# Altium footprint library Power_Lib_Altium.PcbLib: 383 footprints (part 9 of 24)
Each footprint in its own frame and in the unit in brackets; x right, y up, seen from the top. Pads: shape width x height; smd on the part's side, far side on the other; paste and mask are expansions set on the pad; w line width, h text height; cw(c..) or ccw(c..) is an arc to the next point about the centre after c.
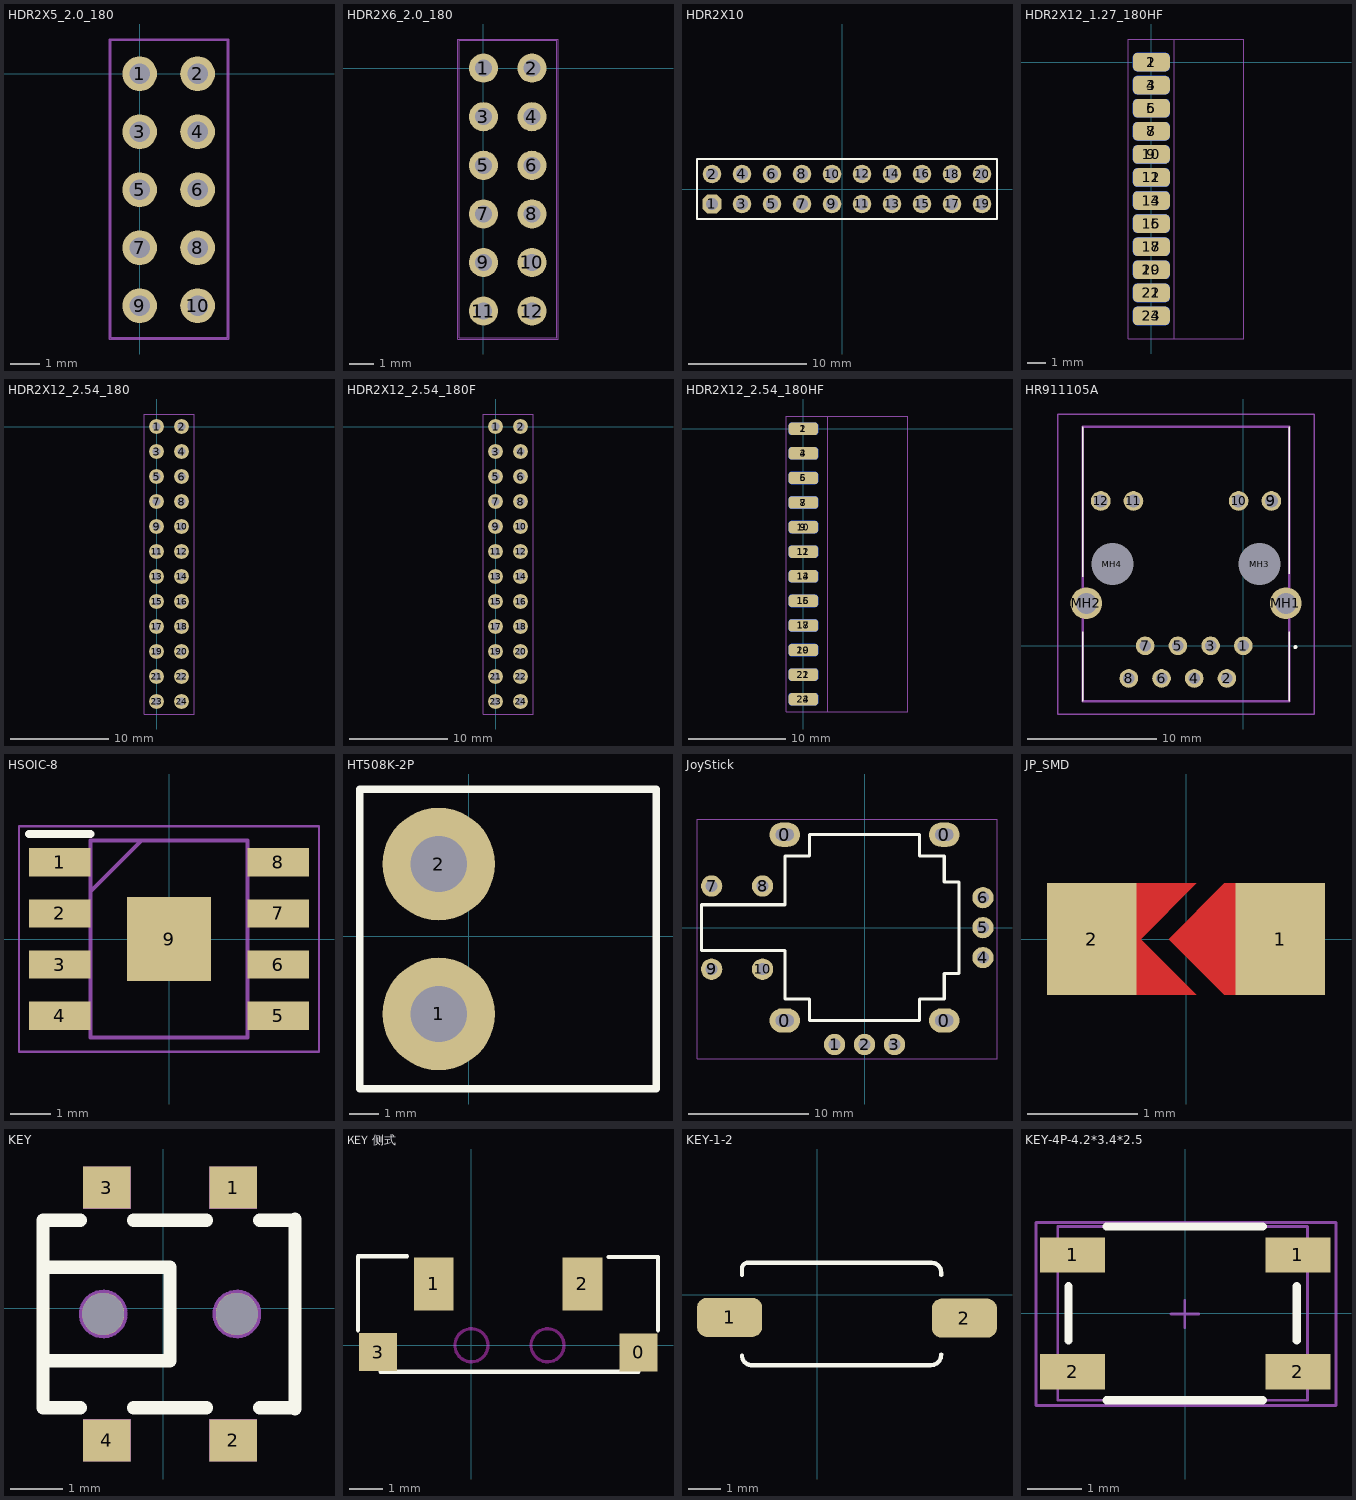
[diagram p8: the footprints below, top view; thin cyan lines are the x and y axes]

## HDR2X5_2.0_180 [mm]
height 4.3
pads (10):
  round 1.2 hole 0.7: 1(0,0) 2(2,0) 3(0,-2) 4(2,-2) 5(0,-4) 6(2,-4) 7(0,-6) 8(2,-6) 9(0,-8) 10(2,-8)
Mechanical 13:
  lines w0.051: -1,-9.1 -1,1.15 3.025,1.15 3.025,-9.1 -1,-9.1
Mechanical 14:
  lines w0.051: -1.05,-9.15 -1.05,1.2 3.075,1.2 3.075,-9.15 -1.05,-9.15

## HDR2X6_2.0_180 [mm]
height 4.3
pads (12):
  round 1.2 hole 0.7: 1(0,0) 2(2,0) 3(0,-2) 4(2,-2) 5(0,-4) 6(2,-4) 7(0,-6) 8(2,-6) 9(0,-8) 10(2,-8) 11(0,-10) 12(2,-10)
Mechanical 13:
  lines w0.051: -1,-11.1 3.025,-11.1 3.025,1.15 -1,1.15 -1,-11.1
Mechanical 14:
  lines w0.051: -1.05,-11.15 3.075,-11.15 3.075,1.2 -1.05,1.2 -1.05,-11.15

## HDR2X10 [mil]
pads (20):
  oct 62x62 hole 40: 1(-435,-50)
  round 62 hole 40: 2(-435,50) 3(-335,-50) 4(-335,50) 5(-235,-50) 6(-235,50) 7(-135,-50) 8(-135,50) 9(-35,-50) 10(-35,50) 11(65,-50) 12(65,50) 13(165,-50) 14(165,50) 15(265,-50) 16(265,50) 17(365,-50) 18(365,50) 19(465,-50) 20(465,50)
Top Overlay:
  lines w8: -485,-100 -485,100 -410,100 515,100 515,-100 -410,-100 -485,-100
3D body "User Library-1x2 TH Pitch 2_54mm.SLDPRT": height 373.85, standoff -125.98, extent 416,-99 516,101
3D body "User Library-1x2 TH Pitch 2_54mm.SLDPRT": height 373.85, standoff -125.98, extent 316,-99 416,101
3D body "User Library-1x2 TH Pitch 2_54mm.SLDPRT": height 373.85, standoff -125.98, extent 216,-99 316,101
3D body "User Library-1x2 TH Pitch 2_54mm.SLDPRT": height 373.85, standoff -125.98, extent 116,-99 216,101
3D body "User Library-1x2 TH Pitch 2_54mm.SLDPRT": height 373.85, standoff -125.98, extent 16,-99 116,101
3D body "User Library-1x2 TH Pitch 2_54mm.SLDPRT": height 373.85, standoff -125.98, extent -84,-99 16,101
3D body "User Library-1x2 TH Pitch 2_54mm.SLDPRT": height 373.85, standoff -125.98, extent -184,-99 -84,101
3D body "User Library-1x2 TH Pitch 2_54mm.SLDPRT": height 373.85, standoff -125.98, extent -284,-99 -184,101
3D body "User Library-1x2 TH Pitch 2_54mm.SLDPRT": height 373.85, standoff -125.98, extent -384,-99 -284,101
3D body "User Library-1x2 TH Pitch 2_54mm.SLDPRT": height 373.85, standoff -125.98, extent -484,-99 -384,101

## HDR2X12_1.27_180HF [mil]
height 169.29
pads (24):
  rrect50% 80x40 smd: 1(0,0) 3(0,-50) 5(0,-100) 7(0,-150) 9(0,-200) 11(0,-250) 13(0,-300) 15(0,-350) 17(0,-400) 19(0,-450) 21(0,-500) 23(0,-550)
  rrect50% 80x40 smd far side: 2(0,0) 4(0,-50) 6(0,-100) 8(0,-150) 10(0,-200) 12(0,-250) 14(0,-300) 16(0,-350) 18(0,-400) 20(0,-450) 22(0,-500) 24(0,-550)
Mechanical 13:
  lines w2: -50,-600 -50,50 200,50 200,-600 -50,-600
Mechanical 14:
  lines w2: -50,-600 -50,50 50,50 50,-600 -50,-600
3D body "female_header_a-bl127-dg-g24d.stp": height 39.02, standoff -83.02, extent -28.34,-582.88 200,32.87

## HDR2X12_2.54_180 [mm]
height 4.3
pads (24):
  round 1.5 hole 0.813: 1(0,0) 2(2.54,0) 3(0,-2.54) 4(2.54,-2.54) 5(0,-5.08) 6(2.54,-5.08) 7(0,-7.62) 8(2.54,-7.62) 9(0,-10.16) 10(2.54,-10.16) 11(0,-12.7) 12(2.54,-12.7) 13(0,-15.24) 14(2.54,-15.24) 15(0,-17.78) 16(2.54,-17.78) 17(0,-20.32) 18(2.54,-20.32) 19(0,-22.86) 20(2.54,-22.86) 21(0,-25.4) 22(2.54,-25.4) 23(0,-27.94) 24(2.54,-27.94)
Mechanical 13:
  lines w0.051: -1.27,-29.21 3.81,-29.21 3.81,1.27 -1.27,1.27 -1.27,-29.21
Mechanical 14:
  lines w0.051: -1.27,-29.21 -1.27,1.27 3.81,1.27 3.81,-29.21 -1.27,-29.21
3D body "pin_header_awl254-dg-g24d.stp": height 8.5, standoff -3, extent -1.27,-29.21 3.81,1.27

## HDR2X12_2.54_180F [mm]
height 4.3
pads (24):
  round 1.5 hole 0.813: 1(0,0) 2(2.54,0) 3(0,-2.54) 4(2.54,-2.54) 5(0,-5.08) 6(2.54,-5.08) 7(0,-7.62) 8(2.54,-7.62) 9(0,-10.16) 10(2.54,-10.16) 11(0,-12.7) 12(2.54,-12.7) 13(0,-15.24) 14(2.54,-15.24) 15(0,-17.78) 16(2.54,-17.78) 17(0,-20.32) 18(2.54,-20.32) 19(0,-22.86) 20(2.54,-22.86) 21(0,-25.4) 22(2.54,-25.4) 23(0,-27.94) 24(2.54,-27.94)
Mechanical 13:
  lines w0.051: -1.27,-29.21 3.81,-29.21 3.81,1.27 -1.27,1.27 -1.27,-29.21
Mechanical 14:
  lines w0.051: -1.27,-29.21 -1.27,1.27 3.81,1.27 3.81,-29.21 -1.27,-29.21
3D body "female_header_a-bl254-dg-g24d.stp": height 8.5, standoff -3.2, extent -1.23,-29.335 3.77,1.395

## HDR2X12_2.54_180HF [mil]
height 169.29
pads (24):
  rrect50% 120x50 smd: 1(0,0) 3(0,-100) 5(0,-200) 7(0,-300) 9(0,-400) 11(0,-500) 13(0,-600) 15(0,-700) 17(0,-800) 19(0,-900) 21(0,-1000) 23(0,-1100)
  rrect50% 120x50 smd far side: 2(0,0) 4(0,-100) 6(0,-200) 8(0,-300) 10(0,-400) 12(0,-500) 14(0,-600) 16(0,-700) 18(0,-800) 20(0,-900) 22(0,-1000) 24(0,-1100)
Mechanical 13:
  lines w2: -70,-1150 425,-1150 425,50 -70,50 -70,-1150
Mechanical 14:
  lines w2: -70,-1150 100,-1150 100,50 -70,50 -70,-1150
Mechanical 15:
  lines w2: -70,-1150 -70,50 100,50 100,-1150 -70,-1150
3D body "female_header_a-bl254-dg-g24d.stp": height 76.43, standoff -120.43, extent -35.97,-1154.92 424.66,54.92

## HR911105A [mm]
pads (16):
  round 1.446 hole 0.89: 1(0,0) 2(-1.27,-2.54) 3(-2.54,0) 4(-3.81,-2.54) 5(-5.08,0) 6(-6.35,-2.54) 7(-7.62,0) 8(-8.89,-2.54)
  round 1.53 hole 1.02: 9(2.18,11.25) 10(-0.36,11.25) 11(-8.53,11.25) 12(-11.07,11.25)
  round 2.445 hole 1.63: MH1(3.3,3.3) MH2(-12.19,3.3)
  round 1.625 hole 3.25 unplated: MH3(1.27,6.35) MH4(-10.16,6.35)
Top Overlay:
  lines w0.1: -12.465,-4.3 -12.465,1.1 -12.465,-4.3 ; -12.465,5.35 -12.465,17 -12.465,5.35 ; 3.575,-4.3 3.575,1.1 3.575,-4.3 ; 3.575,5.6 3.575,17 3.575,5.6
  lines w0.2: 4.05,-0.15 ccw(c4.05,-0.1) 4.05,-0.05 ; 4.05,-0.15 cw(c4.05,-0.1) 4.05,-0.05 ; 4.05,-0.15 ccw(c4.05,-0.1) 4.05,-0.05
Mechanical 13:
  lines w0.2: -12.465,-4.3 3.575,-4.3 3.575,17 -12.465,17 -12.465,-4.3
Mechanical 15:
  lines w0.1: -14.417,-5.3 5.518,-5.3 5.518,18 -14.417,18 -14.417,-5.3
3D body "HR911105A.stp": height 13.53, standoff -2.97, extent -12.39,-4.08 3.49,17.32

## HSOIC-8 [mm]
pads (9):
  rect 1.525x0.7 smd: 1(-2.712,1.905) 2(-2.712,0.635) 3(-2.712,-0.635) 4(-2.712,-1.905) 5(2.712,-1.905) 6(2.712,-0.635) 7(2.712,0.635) 8(2.712,1.905)
  rect 2.09x2.09 smd: 9(0,0)
Top Overlay:
  lines w0.2: -3.475,2.605 -1.95,2.605
Mechanical 13:
  lines w0.1: -1.95,1.18 -0.68,2.45 ; -1.95,-2.45 1.95,-2.45 1.95,2.45 -1.95,2.45 -1.95,-2.45
Mechanical 15:
  lines w0.05: -3.725,-2.8 3.725,-2.8 3.725,2.8 -3.725,2.8 -3.725,-2.8
3D body "IP5306_4.35V.stp": height 1.65, standoff 0, extent -3,-2.45 3,2.45

## HT508K-2P [mil]
pads (2):
  round 150 hole 75: 1(-40,-104) 2(-40,96)
Top Overlay:
  lines w10: -145,-204 -145,196 250,196 250,-204 -145,-204

## JoyStick [mil]
pads (14):
  oval 100x80 hole 40 slot 60 at 0 deg: 0(-261.81,-305.12) 0(-261.81,305.12) 0(261.81,-305.12) 0(261.81,305.12)
  round 70 hole 39.37: 1(-98.43,-383.86) 2(0,-383.86) 3(98.43,-383.86) 4(388.86,-98.43) 5(388.86,0) 6(388.86,98.43) 7(-501.97,136.57) 8(-334.8,136.57) 9(-501.97,-136.57) 10(-334.8,-136.57)
Top Overlay:
  lines w10: -535,-75 -535,75 -261.81,75 -261.81,235 -180,235 -180,305.12 180,305.12 180,235 261.81,235 261.81,150 310,150 310,-150 261.81,-150 261.81,-235 180,-235 180,-305.12 -180,-305.12 -180,-235 -261.81,-235 -261.81,-75 -535,-75
Mechanical 14:
  lines w2: -550,-430 435,-430 435,355 -550,355 -550,-430
3D body "User Library-Joystick_Asm_Left.STEP": height 1126.3, standoff -118.11, extent -592.19,-517.56 518.45,517.79

## JP_SMD [mil]
height 78.74
pads (2):
  rect 32x40 smd: 1(33.75,0) 2(-33.75,0)
Top Layer:
  region: 23.75,20 13.75,20 -6.25,0 13.75,-20 23.75,-20
  region: -26.25,0 -16.25,0 3.75,20 -26.25,20
  region: -26.25,0 -16.25,0 3.75,-20 -26.25,-20
Top Paste:
  region: 23.75,20 13.75,20 -6.25,0 13.75,-20 23.75,-20
  region: -26.25,0 -16.25,0 3.75,20 -26.25,20
  region: -26.25,0 -16.25,0 3.75,-20 -26.25,-20
Top Solder:
  region: 23.75,24 13.75,24 -10.25,0 13.75,-24 23.75,-24
  region: -26.25,0 -12.25,0 11.75,24 -26.25,24
  region: -26.25,0 -12.25,0 11.75,-24 -26.25,-24

## KEY [mm] "轻触开关"
pads (6):
  rect 0.9x0.8 smd: 1(1.327,2.287) 2(1.327,-2.513) 3(-1.073,2.287) 4(-1.073,-2.513)
  round 0.8 hole 0.8 unplated: ""(-1.143,-0.113) ""(1.397,-0.113)
Top Overlay:
  lines w0.254: -1.58,-1.891 -2.286,-1.891 -2.286,1.665 -1.58,1.665 ; -0.566,-1.891 0.82,-1.891 ; -0.566,1.665 0.82,1.665 ; 1.834,-1.891 2.502,-1.891 ; 1.834,1.665 2.502,1.665 ; 2.502,-1.913 2.502,1.687 ; -2.286,-1.002 0.127,-1.002 0.127,0.776 -2.286,0.776 -2.286,-1.002
Mechanical 4:
  circle w0.4: c-1.143,-0.113 r0.2
  circle w0.4: c1.397,-0.113 r0.2
Mechanical 5:
  circle w0.127: c-1.143,-0.113 r0.4
  circle w0.127: c1.397,-0.113 r0.4
  region: 0.877,2.687 1.777,2.687 1.777,1.887 0.877,1.887
  region: 0.877,-2.113 1.777,-2.113 1.777,-2.913 0.877,-2.913
  region: -1.523,2.687 -0.623,2.687 -0.623,1.887 -1.523,1.887
  region: -1.523,-2.113 -0.623,-2.113 -0.623,-2.913 -1.523,-2.913
Mechanical 15:
  lines w0.003: 0.083,0.328 0.133,0.379

## KEY 侧式 [mm] "按键 贴片 侧式"
pads (4):
  rect 1.15x1.15 smd: 0(5.05,-0.216) 3(-2.819,-0.203)
  rect 1.2x1.6 smd: 1(-1.142,1.854) 2(3.354,1.854)
Top Overlay:
  lines w0.127: -3.429,0.457 -3.429,2.692 -1.948,2.692 ; -2.75,-0.8 5.05,-0.8 ; 4.14,2.667 5.639,2.667 5.639,0.457
Keep-Out Layer:
  circle w0.1: c2.3,0 r0.5
  circle w0.1: c0,0 r0.5

## KEY-1-2 [mm]
pads (2):
  rrect50% 2x1.2 smd: 1(-2.692,-0.699) 2(4.521,-0.724)
Top Overlay:
  lines w0.127: -2.311,-1.867 ccw(c-2.007,-1.867) -2.007,-2.172 ; -2.311,0.597 -2.311,0.8 cw(c-2.134,0.8) -2.134,0.978 3.505,0.978 cw(c3.505,0.673) 3.81,0.673 3.81,0.597 ; -2.032,-2.172 3.48,-2.172 ccw(c3.48,-1.841) 3.81,-1.841
3D body "User Library-KEY_SOT_P2.SLDPRT": height 2.36, standoff -0.03, extent -3.206,-2.406 4.934,1.194

## KEY-4P-4.2*3.4*2.5 [mm] "SKRPABE010"
pads (4):
  rect 1.2x0.65 smd: 1(-2.075,1.075) 1(2.075,1.075) 2(-2.075,-1.075) 2(2.075,-1.075)
Top Overlay:
  lines w0.152: -2.15,-0.5 -2.15,0.5 ; -1.45,-1.6 1.425,-1.6 ; -1.45,1.6 1.425,1.6 ; 2.05,-0.5 2.05,0.5
Mechanical 13:
  lines w0.051: -0.263,-0.011 0.245,-0.011 ; -0.009,-0.265 -0.009,0.243 ; -2.35,-1.6 2.25,-1.6 2.25,1.6 -2.35,1.6 -2.35,-1.6
Mechanical 14:
  lines w0.051: -2.75,-1.7 2.775,-1.7 2.775,1.675 -2.75,1.675 -2.75,-1.7
3D body "SKRPABE010.STEP": height 2.5, standoff 0, extent -2.35,-1.6 2.25,1.6